# Altium footprint library LukaLIBRARY.PcbLib: 772 footprints (part 39 of 49)
Each footprint in its own frame and in the unit in brackets; x right, y up, seen from the top. Pads: shape width x height; smd on the part's side, far side on the other; paste and mask are expansions set on the pad; w line width, h text height; cw(c..) or ccw(c..) is an arc to the next point about the centre after c.
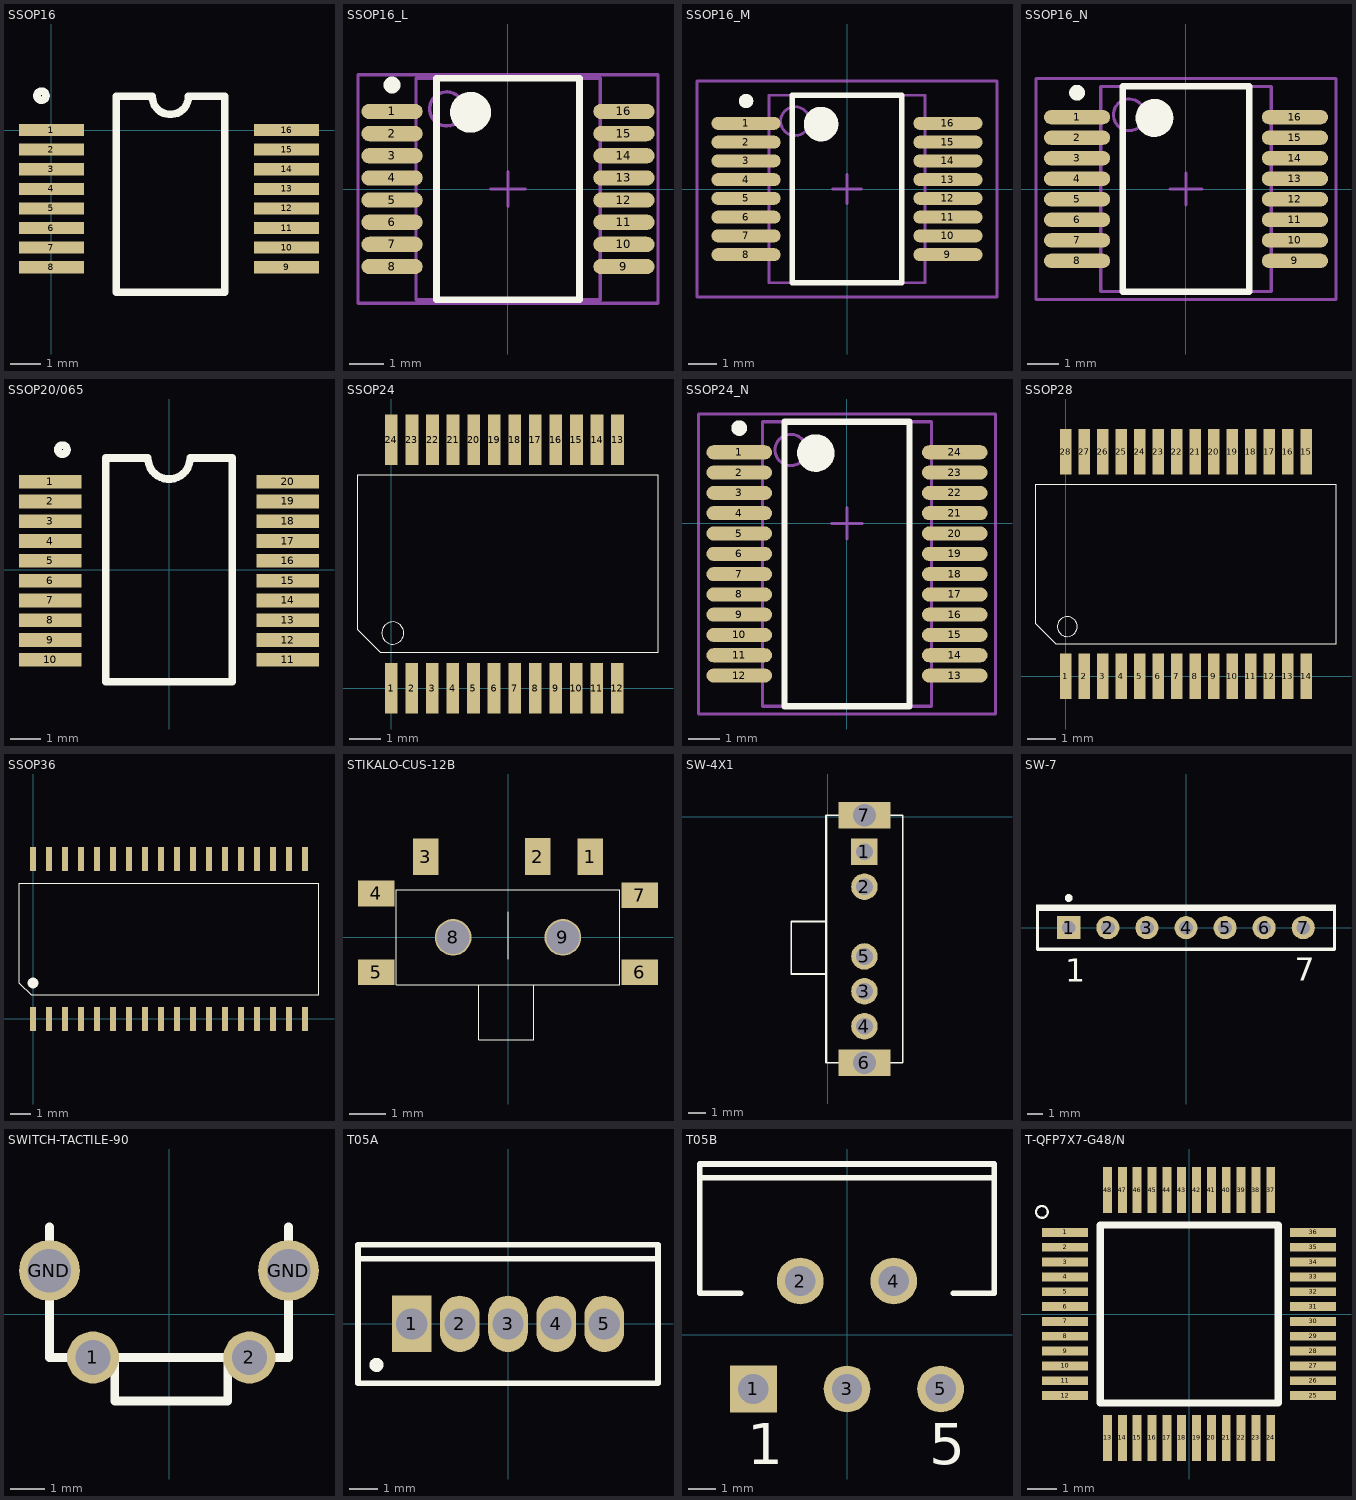
[diagram p38: the footprints below, top view; thin cyan lines are the x and y axes]

## SSOP16 [mm]
pads (16):
  rect 2.15x0.4 smd: 1(0,0) 2(0,-0.65) 3(0,-1.3) 4(0,-1.95) 5(0,-2.6) 6(0,-3.25) 7(0,-3.9) 8(0,-4.55) 9(7.8,-4.55) 10(7.8,-3.9) 11(7.8,-3.25) 12(7.8,-2.6) 13(7.8,-1.95) 14(7.8,-1.3) 15(7.8,-0.65) 16(7.8,0)
Top Overlay:
  circle w0.25: c-0.33,1.14 r0.15
  lines w0.25: 2.145,-5.385 5.745,-5.385 5.745,1.115 4.545,1.115 cw(c3.945,1.115) 3.345,1.115 2.145,1.115 2.145,-5.385

## SSOP16_L [mm] "SOP, 16-Leads, Body 6.2x5.3mm, Pitch 0.65mm, IPC High Density"
height 2
pads (16):
  oval 1.8x0.45 smd: 1(-3.4,2.275) 2(-3.4,1.625) 3(-3.4,0.975) 4(-3.4,0.325) 5(-3.4,-0.325) 6(-3.4,-0.975) 7(-3.4,-1.625) 8(-3.4,-2.275) 9(3.4,-2.275) 10(3.4,-1.625) 11(3.4,-0.975) 12(3.4,-0.325) 13(3.4,0.325) 14(3.4,0.975) 15(3.4,1.625) 16(3.4,2.275)
Top Overlay:
  circle w0.25: c-3.4,3.05 r0.125
  circle w0.6: c-1.1,2.25 r0.3
  lines w0.2: -2.1,-3.25 -2.1,3.25 2.1,3.25 2.1,-3.25 -2.1,-3.25
Mechanical 13:
  circle w0.1: c-1.8,2.35 r0.5
  lines w0.1: -2.7,-3.25 -2.7,3.25 2.7,3.25 2.7,-3.25 -2.7,-3.25
Mechanical 15:
  lines w0.1: -0.5,0 0.5,0 ; 0,-0.5 0,0.5 ; -4.4,-3.35 -4.4,3.35 4.4,3.35 4.4,-3.35 -4.4,-3.35
3D body: height 2, standoff 0, extent -2.7,-3.25 2.7,3.25

## SSOP16_M [mm] "SOP, 16-Leads, Body 6.2x5.3mm, Pitch 0.65mm, IPC Low Density"
height 2
pads (16):
  oval 2.4x0.45 smd: 1(-3.5,2.275) 2(-3.5,1.625) 3(-3.5,0.975) 4(-3.5,0.325) 5(-3.5,-0.325) 6(-3.5,-0.975) 7(-3.5,-1.625) 8(-3.5,-2.275) 9(3.5,-2.275) 10(3.5,-1.625) 11(3.5,-0.975) 12(3.5,-0.325) 13(3.5,0.325) 14(3.5,0.975) 15(3.5,1.625) 16(3.5,2.275)
Top Overlay:
  circle w0.6: c-0.9,2.25 r0.3
  circle w0.25: c-3.5,3.05 r0.125
  lines w0.2: -1.9,-3.25 1.9,-3.25 1.9,3.25 -1.9,3.25 -1.9,-3.25
Mechanical 13:
  circle w0.1: c-1.8,2.35 r0.5
  lines w0.1: -2.7,-3.25 2.7,-3.25 2.7,3.25 -2.7,3.25 -2.7,-3.25
Mechanical 15:
  lines w0.1: -0.5,0 0.5,0 ; 0,-0.5 0,0.5 ; -5.2,-3.75 5.2,-3.75 5.2,3.75 -5.2,3.75 -5.2,-3.75
3D body: height 2, standoff 0, extent -2.7,-3.25 2.7,3.25

## SSOP16_N [mm] "SOP, 16-Leads, Body 6.2x5.3mm, Pitch 0.65mm, IPC Medium Density"
height 2
pads (16):
  oval 2.1x0.45 smd: 1(-3.45,2.275) 2(-3.45,1.625) 3(-3.45,0.975) 4(-3.45,0.325) 5(-3.45,-0.325) 6(-3.45,-0.975) 7(-3.45,-1.625) 8(-3.45,-2.275) 9(3.45,-2.275) 10(3.45,-1.625) 11(3.45,-0.975) 12(3.45,-0.325) 13(3.45,0.325) 14(3.45,0.975) 15(3.45,1.625) 16(3.45,2.275)
Top Overlay:
  circle w0.25: c-3.45,3.05 r0.125
  circle w0.6: c-1,2.25 r0.3
  lines w0.2: -2,-3.25 -2,3.25 2,3.25 2,-3.25 -2,-3.25
Mechanical 13:
  circle w0.1: c-1.8,2.35 r0.5
  lines w0.1: -2.7,-3.25 -2.7,3.25 2.7,3.25 2.7,-3.25 -2.7,-3.25
Mechanical 15:
  lines w0.1: -0.5,0 0.5,0 ; 0,-0.5 0,0.5 ; -4.75,-3.5 -4.75,3.5 4.75,3.5 4.75,-3.5 -4.75,-3.5
3D body: height 2, standoff 0, extent -2.7,-3.25 2.7,3.25

## SSOP20/065 [mm]
pads (20):
  rect 2.05x0.45 smd: 1(-3.9,2.9) 2(-3.9,2.25) 3(-3.9,1.6) 4(-3.9,0.95) 5(-3.9,0.3) 6(-3.9,-0.35) 7(-3.9,-1) 8(-3.9,-1.65) 9(-3.9,-2.3) 10(-3.9,-2.95) 11(3.9,-2.95) 12(3.9,-2.3) 13(3.9,-1.65) 14(3.9,-1) 15(3.9,-0.35) 16(3.9,0.3) 17(3.9,0.95) 18(3.9,1.6) 19(3.9,2.25) 20(3.9,2.9)
Top Overlay:
  circle w0.25: c-3.5,3.95 r0.15
  lines w0.25: -2.075,-3.675 -2.075,3.675 -0.692,3.675 ccw(c0,3.675) 0.692,3.675 2.075,3.675 2.075,-3.675 -2.075,-3.675

## SSOP24 [mm]
pads (24):
  rect 0.4x1.6 smd mask-25.4: 1(0,0) 2(0.65,0) 3(1.3,0) 4(1.95,0) 5(2.6,0) 6(3.25,0) 7(3.9,0) 8(4.55,0) 9(5.2,0) 10(5.85,0) 11(6.5,0) 12(7.15,0) 13(7.155,7.865) 14(6.505,7.865) 15(5.855,7.865) 16(5.205,7.865) 17(4.555,7.865) 18(3.905,7.865) 19(3.255,7.865) 20(2.605,7.865) 21(1.955,7.865) 22(1.305,7.865) 23(0.655,7.865) 24(0.005,7.865)
Top Overlay:
  circle w0.025: c0.05,1.75 r0.35
  lines w0.025: -1.05,1.85 -0.35,1.15 8.433,1.143 8.433,6.756 -1.05,6.75 -1.05,1.85
Top Solder:
  region: -0.2,-0.8 0.2,-0.8 0.2,0.8 -0.2,0.8
  region: 0.45,-0.8 0.85,-0.8 0.85,0.8 0.45,0.8
  region: 1.1,-0.8 1.5,-0.8 1.5,0.8 1.1,0.8
  region: 1.75,-0.8 2.15,-0.8 2.15,0.8 1.75,0.8
  region: 3.05,-0.8 3.45,-0.8 3.45,0.8 3.05,0.8
  region: 3.7,-0.8 4.1,-0.8 4.1,0.8 3.7,0.8
  region: 4.35,-0.8 4.75,-0.8 4.75,0.8 4.35,0.8
  region: 2.4,-0.8 2.8,-0.8 2.8,0.8 2.4,0.8
  region: -0.195,7.065 0.205,7.065 0.205,8.665 -0.195,8.665
  region: 0.455,7.065 0.855,7.065 0.855,8.665 0.455,8.665
  region: 1.105,7.065 1.505,7.065 1.505,8.665 1.105,8.665
  region: 1.755,7.065 2.155,7.065 2.155,8.665 1.755,8.665
  region: 2.405,7.065 2.805,7.065 2.805,8.665 2.405,8.665
  region: 3.055,7.065 3.455,7.065 3.455,8.665 3.055,8.665
  region: 3.705,7.065 4.105,7.065 4.105,8.665 3.705,8.665
  region: 4.355,7.065 4.755,7.065 4.755,8.665 4.355,8.665
  region: 5.65,-0.8 6.05,-0.8 6.05,0.8 5.65,0.8
  region: 6.3,-0.8 6.7,-0.8 6.7,0.8 6.3,0.8
  region: 6.95,-0.8 7.35,-0.8 7.35,0.8 6.95,0.8
  region: 5.655,7.065 6.055,7.065 6.055,8.665 5.655,8.665
  region: 6.305,7.065 6.705,7.065 6.705,8.665 6.305,8.665
  region: 6.955,7.065 7.355,7.065 7.355,8.665 6.955,8.665
  region: 5,-0.8 5.4,-0.8 5.4,0.8 5,0.8
  region: 5.005,7.065 5.405,7.065 5.405,8.665 5.005,8.665

## SSOP24_N [mm] "SOP, 24-Leads, Body 6.2x5.3mm, Pitch 0.65mm, IPC Medium Density"
height 2
pads (24):
  oval 2.1x0.45 smd: 1(-3.45,2.275) 2(-3.45,1.625) 3(-3.45,0.975) 4(-3.45,0.325) 5(-3.45,-0.325) 6(-3.45,-0.975) 7(-3.45,-1.625) 8(-3.45,-2.275) 9(-3.45,-2.92) 10(-3.45,-3.57) 11(-3.45,-4.22) 12(-3.45,-4.87) 13(3.45,-4.87) 14(3.45,-4.22) 15(3.45,-3.57) 16(3.45,-2.92) 17(3.45,-2.275) 18(3.45,-1.625) 19(3.45,-0.975) 20(3.45,-0.325) 21(3.45,0.325) 22(3.45,0.975) 23(3.45,1.625) 24(3.45,2.275)
Top Overlay:
  circle w0.6: c-1,2.25 r0.3
  circle w0.25: c-3.45,3.05 r0.125
  lines w0.2: -2,-5.85 2,-5.85 2,3.25 -2,3.25 -2,-5.85
Mechanical 13:
  circle w0.1: c-1.8,2.35 r0.5
  lines w0.1: -2.7,-5.85 2.7,-5.85 2.7,3.25 -2.7,3.25 -2.7,-5.85
Mechanical 15:
  lines w0.1: -0.5,0 0.5,0 ; 0,-0.5 0,0.5 ; -4.75,-6.1 4.75,-6.1 4.75,3.5 -4.75,3.5 -4.75,-6.1
3D body: height 2, standoff 0, extent -2.7,-5.85 2.7,3.25

## SSOP28 [mm]
pads (28):
  rect 0.4x1.6 smd mask-25.4: 1(0,0) 2(0.65,0) 3(1.3,0) 4(1.95,0) 5(2.6,0) 6(3.25,0) 7(3.9,0) 8(4.55,0) 9(5.2,0) 10(5.85,0) 11(6.5,0) 12(7.15,0) 13(7.8,0) 14(8.45,0) 15(8.45,7.9) 16(7.8,7.9) 17(7.15,7.9) 18(6.5,7.9) 19(5.85,7.9) 20(5.2,7.9) 21(4.55,7.9) 22(3.9,7.9) 23(3.25,7.9) 24(2.6,7.9) 25(1.95,7.9) 26(1.3,7.9) 27(0.65,7.9) 28(0,7.9)
Top Overlay:
  circle w0.025: c0.05,1.75 r0.35
  lines w0.025: -1.05,1.85 -0.35,1.15 9.5,1.15 9.5,6.75 -1.05,6.75 -1.05,1.85
Top Solder:
  region: -0.2,-0.8 0.2,-0.8 0.2,0.8 -0.2,0.8
  region: 0.45,-0.8 0.85,-0.8 0.85,0.8 0.45,0.8
  region: 1.1,-0.8 1.5,-0.8 1.5,0.8 1.1,0.8
  region: 1.75,-0.8 2.15,-0.8 2.15,0.8 1.75,0.8
  region: 3.05,-0.8 3.45,-0.8 3.45,0.8 3.05,0.8
  region: 3.7,-0.8 4.1,-0.8 4.1,0.8 3.7,0.8
  region: 4.35,-0.8 4.75,-0.8 4.75,0.8 4.35,0.8
  region: 2.4,-0.8 2.8,-0.8 2.8,0.8 2.4,0.8
  region: 1.75,7.1 2.15,7.1 2.15,8.7 1.75,8.7
  region: 1.1,7.1 1.5,7.1 1.5,8.7 1.1,8.7
  region: 0.45,7.1 0.85,7.1 0.85,8.7 0.45,8.7
  region: 4.35,7.1 4.75,7.1 4.75,8.7 4.35,8.7
  region: 3.7,7.1 4.1,7.1 4.1,8.7 3.7,8.7
  region: 3.05,7.1 3.45,7.1 3.45,8.7 3.05,8.7
  region: 2.4,7.1 2.8,7.1 2.8,8.7 2.4,8.7
  region: -0.2,7.1 0.2,7.1 0.2,8.7 -0.2,8.7
  region: 5.65,-0.8 6.05,-0.8 6.05,0.8 5.65,0.8
  region: 6.3,-0.8 6.7,-0.8 6.7,0.8 6.3,0.8
  region: 6.95,-0.8 7.35,-0.8 7.35,0.8 6.95,0.8
  region: 7.6,-0.8 8,-0.8 8,0.8 7.6,0.8
  region: 8.25,-0.8 8.65,-0.8 8.65,0.8 8.25,0.8
  region: 8.25,7.1 8.65,7.1 8.65,8.7 8.25,8.7
  region: 7.6,7.1 8,7.1 8,8.7 7.6,8.7
  region: 6.95,7.1 7.35,7.1 7.35,8.7 6.95,8.7
  region: 6.3,7.1 6.7,7.1 6.7,8.7 6.3,8.7
  region: 5.65,7.1 6.05,7.1 6.05,8.7 5.65,8.7
  region: 5,-0.8 5.4,-0.8 5.4,0.8 5,0.8
  region: 5,7.1 5.4,7.1 5.4,8.7 5,8.7

## SSOP36 [mm]
pads (36):
  rect 0.32x1.2 smd mask-25.4: 1(0,0) 2(0.8,0) 3(1.6,0) 4(2.4,0) 5(3.2,0) 6(4,0) 7(4.8,0) 8(5.6,0) 9(6.4,0) 10(7.2,0) 11(8,0) 12(8.8,0) 13(9.6,0) 14(10.4,0) 15(11.2,0) 16(12,0) 17(12.8,0) 18(13.6,0) 19(13.6,8) 20(12.8,8) 21(12,8) 22(11.2,8) 23(10.4,8) 24(9.6,8) 25(8.8,8) 26(8,8) 27(7.2,8) 28(6.4,8) 29(5.6,8) 30(4.8,8) 31(4,8) 32(3.2,8) 33(2.4,8) 34(1.6,8) 35(0.8,8) 36(0,8)
Top Overlay:
  circle w0.254: c0,1.8 r0.14
  lines w0.025: -0.7,1.8 -0.7,6.8 14.3,6.8 14.3,1.2 -0.1,1.2 -0.7,1.8
Top Solder:
  region: -0.16,7.4 0.16,7.4 0.16,8.6 -0.16,8.6
  region: -0.16,-0.6 0.16,-0.6 0.16,0.6 -0.16,0.6
  region: 7.84,7.4 8.16,7.4 8.16,8.6 7.84,8.6
  region: 8.64,7.4 8.96,7.4 8.96,8.6 8.64,8.6
  region: 9.44,7.4 9.76,7.4 9.76,8.6 9.44,8.6
  region: 10.24,7.4 10.56,7.4 10.56,8.6 10.24,8.6
  region: 11.04,7.4 11.36,7.4 11.36,8.6 11.04,8.6
  region: 11.84,7.4 12.16,7.4 12.16,8.6 11.84,8.6
  region: 12.64,7.4 12.96,7.4 12.96,8.6 12.64,8.6
  region: 13.44,7.4 13.76,7.4 13.76,8.6 13.44,8.6
  region: 13.44,-0.6 13.76,-0.6 13.76,0.6 13.44,0.6
  region: 12.64,-0.6 12.96,-0.6 12.96,0.6 12.64,0.6
  region: 11.84,-0.6 12.16,-0.6 12.16,0.6 11.84,0.6
  region: 11.04,-0.6 11.36,-0.6 11.36,0.6 11.04,0.6
  region: 10.24,-0.6 10.56,-0.6 10.56,0.6 10.24,0.6
  region: 9.44,-0.6 9.76,-0.6 9.76,0.6 9.44,0.6
  region: 8.64,-0.6 8.96,-0.6 8.96,0.6 8.64,0.6
  region: 7.84,-0.6 8.16,-0.6 8.16,0.6 7.84,0.6
  region: 0.64,7.4 0.96,7.4 0.96,8.6 0.64,8.6
  region: 1.44,7.4 1.76,7.4 1.76,8.6 1.44,8.6
  region: 2.24,7.4 2.56,7.4 2.56,8.6 2.24,8.6
  region: 3.04,7.4 3.36,7.4 3.36,8.6 3.04,8.6
  region: 3.84,7.4 4.16,7.4 4.16,8.6 3.84,8.6
  region: 4.64,7.4 4.96,7.4 4.96,8.6 4.64,8.6
  region: 5.44,7.4 5.76,7.4 5.76,8.6 5.44,8.6
  region: 6.24,7.4 6.56,7.4 6.56,8.6 6.24,8.6
  region: 7.04,7.4 7.36,7.4 7.36,8.6 7.04,8.6
  region: 7.04,-0.6 7.36,-0.6 7.36,0.6 7.04,0.6
  region: 6.24,-0.6 6.56,-0.6 6.56,0.6 6.24,0.6
  region: 5.44,-0.6 5.76,-0.6 5.76,0.6 5.44,0.6
  region: 4.64,-0.6 4.96,-0.6 4.96,0.6 4.64,0.6
  region: 3.84,-0.6 4.16,-0.6 4.16,0.6 3.84,0.6
  region: 3.04,-0.6 3.36,-0.6 3.36,0.6 3.04,0.6
  region: 2.24,-0.6 2.56,-0.6 2.56,0.6 2.24,0.6
  region: 1.44,-0.6 1.76,-0.6 1.76,0.6 1.44,0.6
  region: 0.64,-0.6 0.96,-0.6 0.96,0.6 0.64,0.6

## STIKALO-CUS-12B [mm]
pads (9):
  rect 0.7x1 smd: 1(2.25,2.2) 2(0.813,2.21) 3(-2.25,2.2)
  rect 1x0.7 smd: 4(-3.6,1.2) 5(-3.6,-0.95) 6(3.6,-0.95) 7(3.6,1.15)
  round 1 hole 0.9 unplated: 8(-1.5,0) 9(1.5,0)
Top Overlay:
  lines w0.03: -0.15,-1.3 3.05,-1.3 3.05,1.3 -3.05,1.3 -3.05,-1.3 0,-1.3 ; 0,-0.6 0,0.7 ; -0.8,-2.8 0.7,-2.8 0.7,-1.3 -0.8,-1.3 -0.8,-2.8

## SW-4X1 [mm]
pads (7):
  rect 1.524x1.524 hole 0.965 mask-25.4: 1(2.1,-2)
  round 1.524 hole 0.965 mask-25.4: 2(2.1,-4) 3(2.1,-10) 4(2.1,-12) 5(2.1,-8)
  rect 3x1.524 hole 1.3 mask-25.4: 6(2.1,-14.1) 7(2.1,0.1)
Top Overlay:
  lines w0.1: -0.1,-9 -2.1,-9 -2.1,-6 -0.1,-6 ; 1.3,-14.1 -0.1,-14.1 -0.1,0.1 1.3,0.1 ; 2.9,-14.1 4.3,-14.1 4.3,0.1 2.9,0.1
Top Solder:
  region: 2.1,-9.231 1.901,-9.258 1.716,-9.334 1.557,-9.457 1.434,-9.616 1.358,-9.801 1.331,-10 1.358,-10.199 1.434,-10.384 1.557,-10.543 1.716,-10.666 1.901,-10.742 2.1,-10.769 2.299,-10.742 2.484,-10.666 2.643,-10.543 2.766,-10.384 2.842,-10.199 2.869,-10 2.842,-9.801 2.766,-9.616 2.643,-9.457 2.484,-9.334 2.299,-9.258
  region: 2.1,-11.231 1.901,-11.258 1.716,-11.334 1.557,-11.457 1.434,-11.616 1.358,-11.801 1.331,-12 1.358,-12.199 1.434,-12.384 1.557,-12.543 1.716,-12.666 1.901,-12.742 2.1,-12.769 2.299,-12.742 2.484,-12.666 2.643,-12.543 2.766,-12.384 2.842,-12.199 2.869,-12 2.842,-11.801 2.766,-11.616 2.643,-11.457 2.484,-11.334 2.299,-11.258
  region: 2.1,-7.231 1.901,-7.258 1.716,-7.334 1.557,-7.457 1.434,-7.616 1.358,-7.801 1.331,-8 1.358,-8.199 1.434,-8.384 1.557,-8.543 1.716,-8.666 1.901,-8.742 2.1,-8.769 2.299,-8.742 2.484,-8.666 2.643,-8.543 2.766,-8.384 2.842,-8.199 2.869,-8 2.842,-7.801 2.766,-7.616 2.643,-7.457 2.484,-7.334 2.299,-7.258
  region: 2.1,-3.231 1.901,-3.258 1.716,-3.334 1.557,-3.457 1.434,-3.616 1.358,-3.801 1.331,-4 1.358,-4.199 1.434,-4.384 1.557,-4.543 1.716,-4.666 1.901,-4.742 2.1,-4.769 2.299,-4.742 2.484,-4.666 2.643,-4.543 2.766,-4.384 2.842,-4.199 2.869,-4 2.842,-3.801 2.766,-3.616 2.643,-3.457 2.484,-3.334 2.299,-3.258
  region: 1.338,-2.762 2.862,-2.762 2.862,-1.238 1.338,-1.238
  region: 3.6,-0.662 3.6,0.862 0.6,0.862 0.6,-0.662
  region: 3.6,-14.862 3.6,-13.338 0.6,-13.338 0.6,-14.862
Bottom Solder:
  region: 2.1,-9.231 1.901,-9.258 1.716,-9.334 1.557,-9.457 1.434,-9.616 1.358,-9.801 1.331,-10 1.358,-10.199 1.434,-10.384 1.557,-10.543 1.716,-10.666 1.901,-10.742 2.1,-10.769 2.299,-10.742 2.484,-10.666 2.643,-10.543 2.766,-10.384 2.842,-10.199 2.869,-10 2.842,-9.801 2.766,-9.616 2.643,-9.457 2.484,-9.334 2.299,-9.258
  region: 2.1,-11.231 1.901,-11.258 1.716,-11.334 1.557,-11.457 1.434,-11.616 1.358,-11.801 1.331,-12 1.358,-12.199 1.434,-12.384 1.557,-12.543 1.716,-12.666 1.901,-12.742 2.1,-12.769 2.299,-12.742 2.484,-12.666 2.643,-12.543 2.766,-12.384 2.842,-12.199 2.869,-12 2.842,-11.801 2.766,-11.616 2.643,-11.457 2.484,-11.334 2.299,-11.258
  region: 2.1,-7.231 1.901,-7.258 1.716,-7.334 1.557,-7.457 1.434,-7.616 1.358,-7.801 1.331,-8 1.358,-8.199 1.434,-8.384 1.557,-8.543 1.716,-8.666 1.901,-8.742 2.1,-8.769 2.299,-8.742 2.484,-8.666 2.643,-8.543 2.766,-8.384 2.842,-8.199 2.869,-8 2.842,-7.801 2.766,-7.616 2.643,-7.457 2.484,-7.334 2.299,-7.258
  region: 2.1,-3.231 1.901,-3.258 1.716,-3.334 1.557,-3.457 1.434,-3.616 1.358,-3.801 1.331,-4 1.358,-4.199 1.434,-4.384 1.557,-4.543 1.716,-4.666 1.901,-4.742 2.1,-4.769 2.299,-4.742 2.484,-4.666 2.643,-4.543 2.766,-4.384 2.842,-4.199 2.869,-4 2.842,-3.801 2.766,-3.616 2.643,-3.457 2.484,-3.334 2.299,-3.258
  region: 1.338,-2.762 2.862,-2.762 2.862,-1.238 1.338,-1.238
  region: 3.6,-0.662 3.6,0.862 0.6,0.862 0.6,-0.662
  region: 3.6,-14.862 3.6,-13.338 0.6,-13.338 0.6,-14.862

## SW-7 [mm] "Switch; 7 Leads"
pads (7):
  rect 1.5x1.5 hole 0.9: 1(-7.62,0)
  round 1.5 hole 0.9: 2(-5.08,0) 3(-2.54,0) 4(0,0) 5(2.54,0) 6(5.08,0) 7(7.62,0)
Top Overlay:
  circle w0.25: c-7.625,1.929 r0.125
  rectangle: -9.75,1.1 9.75,1.5
  lines w0.2: -9.65,1.4 -9.65,-1.4 9.65,-1.4 9.65,1.4
  text "7" at 7.084,-3.445 h1.5
  text "1" at -7.851,-3.526 h1.5

## SWITCH-TACTILE-90 [mil]
pads (4):
  round 60 hole 40: 1(-87.5,-50) 2(92.5,-50)
  round 70 hole 50: GND(-137.5,50) GND(137.5,50)
Top Overlay:
  lines w10: -137.5,100 -137.5,-50 137.5,-50 137.5,100 ; -62.5,-50 -62.5,-100 67.5,-100 67.5,-50

## T05A [mm] "TO, Thru-Hole, Vertical, Heatsink Mounted; 5 In-Line Leads; Pitch 1.70 mm"
height 15.9
pads (5):
  rect 1.4x2 hole 1.1: 1(-3.4,0)
  oval 1.4x2 hole 1.1: 2(-1.7,0) 3(0,0) 4(1.7,0) 5(3.4,0)
Top Overlay:
  circle w0.25: c-4.65,-1.45 r0.125
  lines w0.2: -5.3,2.3 5.3,2.3 ; -5.3,-2.1 -5.3,2.8 5.3,2.8 5.3,-2.1 -5.3,-2.1
Mechanical 13:
  lines w0.1: -5.3,2.3 5.3,2.3 ; -5.3,-2.1 5.3,-2.1 5.3,2.8 -5.3,2.8 -5.3,-2.1 ; -3.91,-0.28 -2.89,-0.28 -2.89,0.28 -3.91,0.28 -3.91,-0.28 ; -2.21,-0.28 -1.19,-0.28 -1.19,0.28 -2.21,0.28 -2.21,-0.28 ; -0.51,-0.28 0.51,-0.28 0.51,0.28 -0.51,0.28 -0.51,-0.28 ; 1.19,-0.28 2.21,-0.28 2.21,0.28 1.19,0.28 1.19,-0.28 ; 2.89,-0.28 3.91,-0.28 3.91,0.28 2.89,0.28 2.89,-0.28
Mechanical 15:
  lines w0.1: -0.5,0 0.5,0 ; 0,-0.5 0,0.5
3D body: height 4.1, standoff 0, extent -3.909,-0.279 -2.891,0.279
3D body: height 4.1, standoff 0, extent -2.209,-0.279 -1.191,0.279
3D body: height 4.1, standoff 0, extent 1.191,-0.279 2.209,0.279
3D body: height 4.1, standoff 0, extent 2.891,-0.279 3.909,0.279
3D body: height 4.1, standoff 0, extent -0.509,-0.279 0.509,0.279
3D body: height 15.9, standoff 13, extent -5.299,2.301 5.299,2.799
3D body: height 13, standoff 4.1, extent -5.35,-2.15 5.35,2.85

## T05B [mm] "TO, Thru-Hole, Vertical, Heatsink Mounted; 5 Bent Staggered Leads; Pitch 1.7 mm"
height 21.1
pads (5):
  rect 1.7x1.7 hole 1.1: 1(-3.4,-1.96)
  round 1.7 hole 1.1: 2(-1.7,1.96) 3(0,-1.96) 4(1.7,1.96) 5(3.4,-1.96)
Top Overlay:
  lines w0.2: -5.35,5.71 5.35,5.71 ; -3.854,1.51 -5.35,1.51 -5.35,6.21 5.35,6.21 5.35,1.51 3.854,1.51
  text "5" at 2.98,-4.685 h1.5
  text "1" at -3.62,-4.685 h1.5

## T-QFP7X7-G48/N [mm]
pads (48):
  rect 1.55x0.3 smd: 1(-4.175,2.75) 2(-4.175,2.25) 3(-4.175,1.75) 4(-4.175,1.25) 5(-4.175,0.75) 6(-4.175,0.25) 7(-4.175,-0.25) 8(-4.175,-0.75) 9(-4.175,-1.25) 10(-4.175,-1.75) 11(-4.175,-2.25) 12(-4.175,-2.75) 25(4.175,-2.75) 26(4.175,-2.25) 27(4.175,-1.75) 28(4.175,-1.25) 29(4.175,-0.75) 30(4.175,-0.25) 31(4.175,0.25) 32(4.175,0.75) 33(4.175,1.25) 34(4.175,1.75) 35(4.175,2.25) 36(4.175,2.75)
  rect 0.3x1.55 smd: 13(-2.75,-4.175) 14(-2.25,-4.175) 15(-1.75,-4.175) 16(-1.25,-4.175) 17(-0.75,-4.175) 18(-0.25,-4.175) 19(0.25,-4.175) 20(0.75,-4.175) 21(1.25,-4.175) 22(1.75,-4.175) 23(2.25,-4.175) 24(2.75,-4.175) 37(2.75,4.175) 38(2.25,4.175) 39(1.75,4.175) 40(1.25,4.175) 41(0.75,4.175) 42(0.25,4.175) 43(-0.25,4.175) 44(-0.75,4.175) 45(-1.25,4.175) 46(-1.75,4.175) 47(-2.25,4.175) 48(-2.75,4.175)
Top Overlay:
  circle w0.076: c-4.96,3.44 r0.2
  lines w0.25: -3,-3 -3,3 3,3 3,-3 -3,-3